# Altium footprint library AltiumLibrary.PcbLib: 129 footprints (part 1 of 9)
Each footprint in its own frame and in the unit in brackets; x right, y up, seen from the top. Pads: shape width x height; smd on the part's side, far side on the other; paste and mask are expansions set on the pad; w line width, h text height; cw(c..) or ccw(c..) is an arc to the next point about the centre after c.
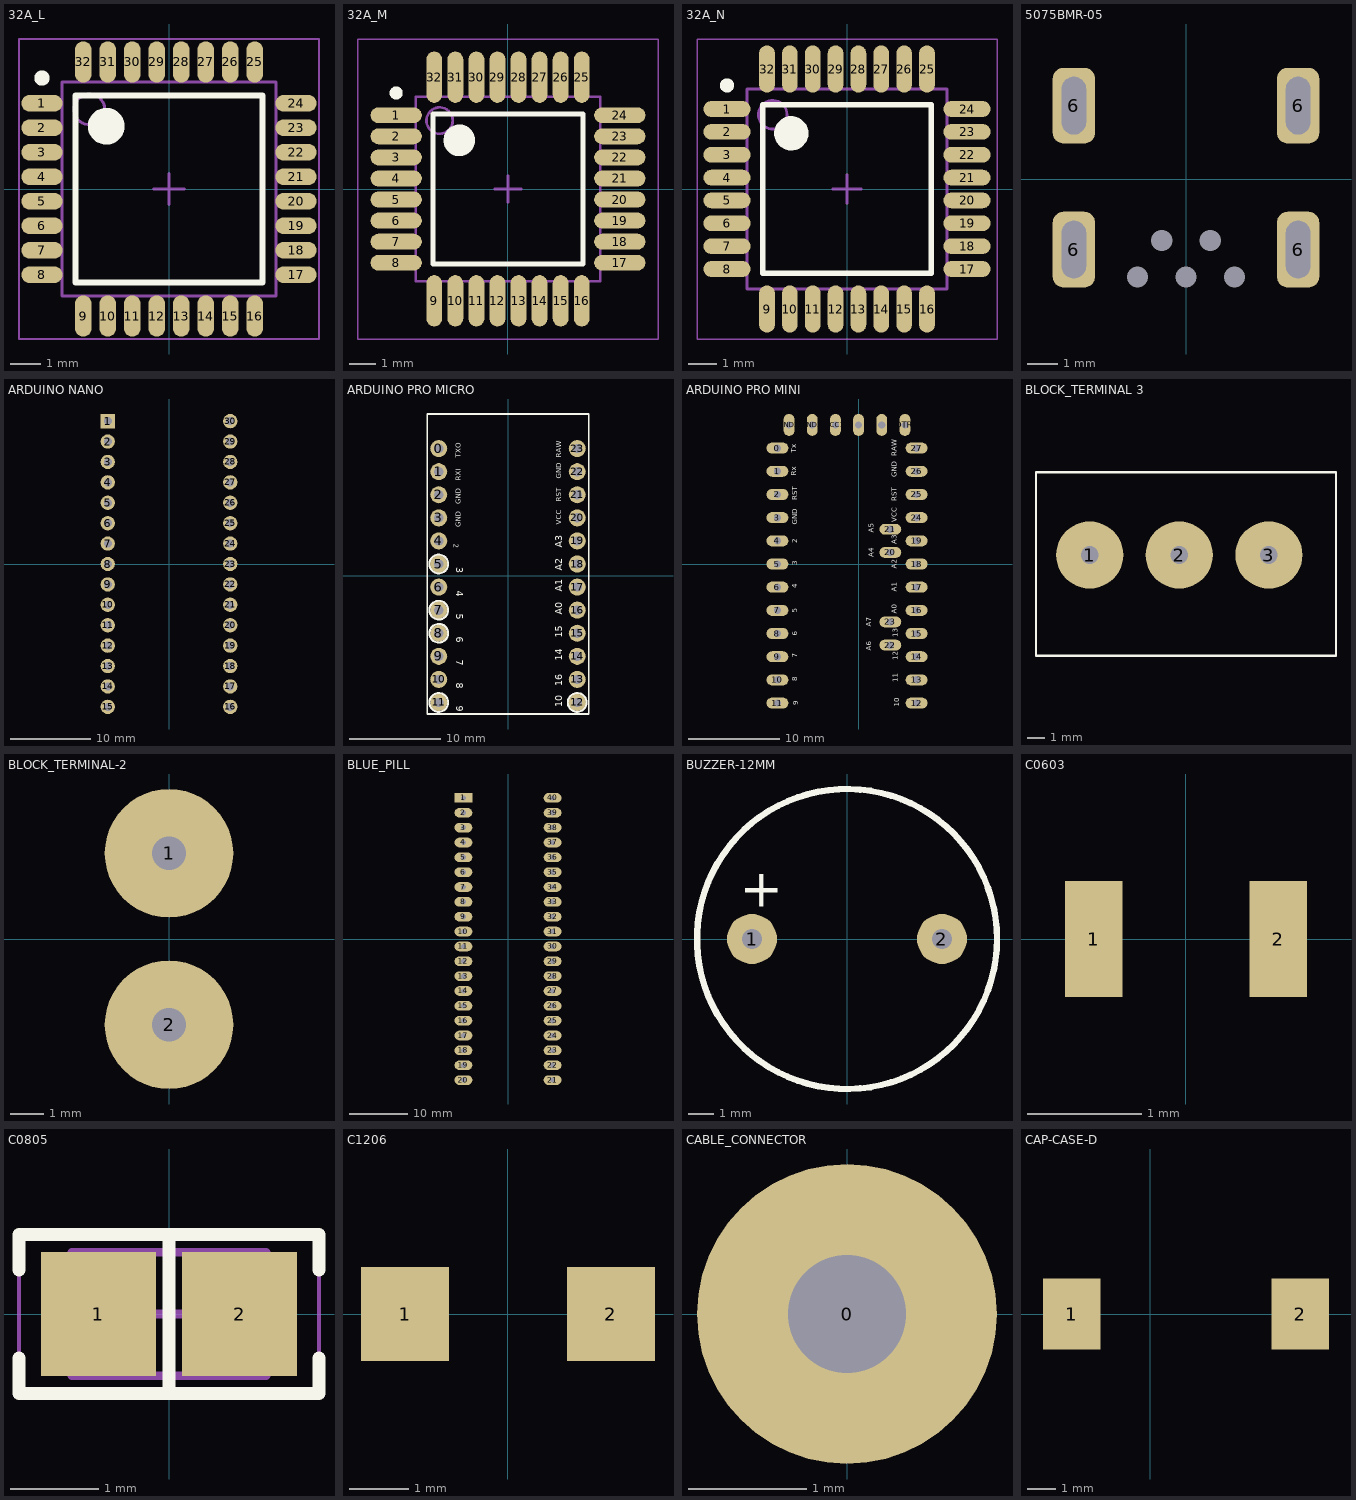
[diagram p0: the footprints below, top view; thin cyan lines are the x and y axes]

## 32A_L [mm] "Thin QFP, 32-Leads, Body 7x7mm, Pitch 0.8mm, IPC High Density"
height 1.2
pads (32):
  oval 1.35x0.55 smd: 1(-4.15,2.8) 2(-4.15,2) 3(-4.15,1.2) 4(-4.15,0.4) 5(-4.15,-0.4) 6(-4.15,-1.2) 7(-4.15,-2) 8(-4.15,-2.8) 17(4.15,-2.8) 18(4.15,-2) 19(4.15,-1.2) 20(4.15,-0.4) 21(4.15,0.4) 22(4.15,1.2) 23(4.15,2) 24(4.15,2.8)
  oval 0.55x1.35 smd: 9(-2.8,-4.15) 10(-2,-4.15) 11(-1.2,-4.15) 12(-0.4,-4.15) 13(0.4,-4.15) 14(1.2,-4.15) 15(2,-4.15) 16(2.8,-4.15) 25(2.8,4.15) 26(2,4.15) 27(1.2,4.15) 28(0.4,4.15) 29(-0.4,4.15) 30(-1.2,4.15) 31(-2,4.15) 32(-2.8,4.15)
Top Overlay:
  circle w0.6: c-2.05,2.05 r0.3
  circle w0.25: c-4.15,3.625 r0.125
  lines w0.2: -3.05,-3.05 3.05,-3.05 3.05,3.05 -3.05,3.05 -3.05,-3.05
Mechanical 13:
  circle w0.1: c-2.6,2.6 r0.5
  lines w0.1: -3.5,-3.5 3.5,-3.5 3.5,3.5 -3.5,3.5 -3.5,-3.5
Mechanical 15:
  lines w0.05: -4.9,-4.9 4.9,-4.9 4.9,4.9 -4.9,4.9 -4.9,-4.9
  lines w0.1: -0.5,0 0.5,0 ; 0,-0.5 0,0.5
3D body: height 1.2, standoff 0, extent -3.5,-3.5 3.5,3.5

## 32A_M [mm] "Thin QFP, 32-Leads, Body 7x7mm, Pitch 0.8mm, IPC Low Density"
height 1.2
pads (32):
  oval 1.95x0.6 smd: 1(-4.25,2.8) 2(-4.25,2) 3(-4.25,1.2) 4(-4.25,0.4) 5(-4.25,-0.4) 6(-4.25,-1.2) 7(-4.25,-2) 8(-4.25,-2.8) 17(4.25,-2.8) 18(4.25,-2) 19(4.25,-1.2) 20(4.25,-0.4) 21(4.25,0.4) 22(4.25,1.2) 23(4.25,2) 24(4.25,2.8)
  oval 0.6x1.95 smd: 9(-2.8,-4.25) 10(-2,-4.25) 11(-1.2,-4.25) 12(-0.4,-4.25) 13(0.4,-4.25) 14(1.2,-4.25) 15(2,-4.25) 16(2.8,-4.25) 25(2.8,4.25) 26(2,4.25) 27(1.2,4.25) 28(0.4,4.25) 29(-0.4,4.25) 30(-1.2,4.25) 31(-2,4.25) 32(-2.8,4.25)
Top Overlay:
  circle w0.25: c-4.25,3.65 r0.125
  circle w0.6: c-1.85,1.85 r0.3
  lines w0.2: -2.85,-2.85 -2.85,2.85 2.85,2.85 2.85,-2.85 -2.85,-2.85
Mechanical 13:
  circle w0.1: c-2.6,2.6 r0.5
  lines w0.1: -3.5,-3.5 -3.5,3.5 3.5,3.5 3.5,-3.5 -3.5,-3.5
Mechanical 15:
  lines w0.05: -5.7,-5.7 -5.7,5.7 5.7,5.7 5.7,-5.7 -5.7,-5.7
  lines w0.1: -0.5,0 0.5,0 ; 0,-0.5 0,0.5
3D body: height 1.2, standoff 0, extent -3.5,-3.5 3.5,3.5

## 32A_N [mm] "Thin QFP, 32-Leads, Body 7x7mm, Pitch 0.8mm, IPC Medium Density"
height 1.2
pads (32):
  oval 1.65x0.55 smd: 1(-4.2,2.8) 2(-4.2,2) 3(-4.2,1.2) 4(-4.2,0.4) 5(-4.2,-0.4) 6(-4.2,-1.2) 7(-4.2,-2) 8(-4.2,-2.8) 17(4.2,-2.8) 18(4.2,-2) 19(4.2,-1.2) 20(4.2,-0.4) 21(4.2,0.4) 22(4.2,1.2) 23(4.2,2) 24(4.2,2.8)
  oval 0.55x1.65 smd: 9(-2.8,-4.2) 10(-2,-4.2) 11(-1.2,-4.2) 12(-0.4,-4.2) 13(0.4,-4.2) 14(1.2,-4.2) 15(2,-4.2) 16(2.8,-4.2) 25(2.8,4.2) 26(2,4.2) 27(1.2,4.2) 28(0.4,4.2) 29(-0.4,4.2) 30(-1.2,4.2) 31(-2,4.2) 32(-2.8,4.2)
Top Overlay:
  circle w0.6: c-1.95,1.95 r0.3
  circle w0.25: c-4.2,3.625 r0.125
  lines w0.2: -2.95,-2.95 2.95,-2.95 2.95,2.95 -2.95,2.95 -2.95,-2.95
Mechanical 13:
  circle w0.1: c-2.6,2.6 r0.5
  lines w0.1: -3.5,-3.5 3.5,-3.5 3.5,3.5 -3.5,3.5 -3.5,-3.5
Mechanical 15:
  lines w0.05: -5.25,-5.25 5.25,-5.25 5.25,5.25 -5.25,5.25 -5.25,-5.25
  lines w0.1: -0.5,0 0.5,0 ; 0,-0.5 0,0.5
3D body: height 1.2, standoff 0, extent -3.5,-3.5 3.5,3.5

## 5075BMR-05 [mm]
pads (9):
  round 0 hole 0.7: 1(-1.6,-3.225) 2(-0.8,-2.025) 3(0,-3.225) 4(0.8,-2.025) 5(1.6,-3.225)
  rrect50% 1.4x2.5 hole 1.9 slot 0.8 at 0 deg: 6(-3.7,-2.325) 6(-3.7,2.425) 6(3.7,-2.325) 6(3.7,2.425)
Multi-Layer:
  region: 1.35,-1.475 1.35,-1.366 1.266,-1.163 1.112,-1.009 0.909,-0.925 0.691,-0.925 0.488,-1.009 0.334,-1.163 0.25,-1.366 0.25,-1.475 0.25,-2.025 0.25,-2.134 0.334,-2.337 0.488,-2.491 0.691,-2.575 0.909,-2.575 1.112,-2.491 1.266,-2.337 1.35,-2.134 1.35,-2.025
  region: -0.25,-1.475 -0.25,-1.366 -0.334,-1.163 -0.488,-1.009 -0.691,-0.925 -0.909,-0.925 -1.112,-1.009 -1.266,-1.163 -1.35,-1.366 -1.35,-1.475 -1.35,-2.025 -1.35,-2.134 -1.266,-2.337 -1.112,-2.491 -0.909,-2.575 -0.691,-2.575 -0.488,-2.491 -0.334,-2.337 -0.25,-2.134 -0.25,-2.025
  region: 1.05,-3.775 1.05,-3.884 1.134,-4.087 1.288,-4.241 1.491,-4.325 1.709,-4.325 1.912,-4.241 2.066,-4.087 2.15,-3.884 2.15,-3.775 2.15,-3.225 2.15,-3.116 2.066,-2.913 1.912,-2.759 1.709,-2.675 1.491,-2.675 1.288,-2.759 1.134,-2.913 1.05,-3.116 1.05,-3.225
  region: -0.55,-3.775 -0.55,-3.884 -0.466,-4.087 -0.312,-4.241 -0.109,-4.325 0.109,-4.325 0.312,-4.241 0.466,-4.087 0.55,-3.884 0.55,-3.775 0.55,-3.225 0.55,-3.116 0.466,-2.913 0.312,-2.759 0.109,-2.675 -0.109,-2.675 -0.312,-2.759 -0.466,-2.913 -0.55,-3.116 -0.55,-3.225
  region: -2.15,-3.775 -2.15,-3.884 -2.066,-4.087 -1.912,-4.241 -1.709,-4.325 -1.491,-4.325 -1.288,-4.241 -1.134,-4.087 -1.05,-3.884 -1.05,-3.775 -1.05,-3.225 -1.05,-3.116 -1.134,-2.913 -1.288,-2.759 -1.491,-2.675 -1.709,-2.675 -1.912,-2.759 -2.066,-2.913 -2.15,-3.116 -2.15,-3.225
3D body "SW3dPS-USB-Mini-B.STEP": height 3.95, standoff -1.8, extent -3.85,-3.4 3.85,5.6

## ARDUINO NANO [mil]
pads (30):
  rect 70x70 / inner round 63.62 / far side rect 63.62x63.62 hole 39.37: 1(-300,700)
  round 70 hole 39.37: 2(-300,600) 3(-300,500) 4(-300,400) 5(-300,300) 6(-300,200) 7(-300,100) 8(-300,0) 9(-300,-100) 10(-300,-200) 11(-300,-300) 12(-300,-400) 13(-300,-500) 14(-300,-600) 15(-300,-700) 16(300,-700) 17(300,-600) 18(300,-500) 19(300,-400) 20(300,-300) 21(300,-200) 22(300,-100) 23(300,0) 24(300,100) 25(300,200) 26(300,300) 27(300,400) 28(300,500) 29(300,600) 30(300,700)
3D body "User Library-arduino_nano.STEP": height 497.64, standoff -234.65, extent -352,-920.65 356.66,851

## ARDUINO PRO MICRO [mil]
pads (24):
  round 74 hole 40: 0(-300,550) 1(-300,450) 2(-300,350) 3(-300,250) 4(-300,150) 5(-300,50) 6(-300,-50) 7(-300,-150) 8(-300,-250) 9(-300,-350) 10(-300,-450) 11(-300,-550) 12(300,-550) 13(300,-450) 14(300,-350) 15(300,-250) 16(300,-150) 17(300,-50) 18(300,50) 19(300,150) 20(300,250) 21(300,350) 22(300,450) 23(300,550)
Top Overlay:
  circle w10: c300,-550 r40
  circle w10: c-300,-550 r40
  circle w10: c-300,50 r40
  circle w10: c-300,-150 r40
  circle w10: c-300,-250 r40
  lines w8: -350,-600 350,-600 350,700 -350,700 -350,-600
  text "10" at 235,-570 h30
  text "16" at 235,-480 h30
  text "14" at 235,-370 h30
  text "15" at 235,-270 h30
  text "A0" at 235,-170 h30
  text "A1" at 235,-70 h30
  text "A2" at 235,20 h30
  text "A3" at 235,120 h30
  text "VCC" at 231,220 h22
  text "RST" at 231,320 h22
  text "GND" at 231,420 h22
  text "RAW" at 231,510 h22
  text "TXO" at -204,510 h22
  text "RXI" at -204,410 h22
  text "GND" at -204,310 h22
  text "GND" at -204,210 h22
  text "2" at -236,137 h22
  text "3" at -225,35 h30
  text "4" at -225,-65 h30
  text "5" at -225,-165 h30
  text "6" at -225,-265 h30
  text "7" at -225,-365 h30
  text "8" at -225,-465 h30
  text "9" at -225,-565 h30
Bottom Overlay:
  lines w10: -350,-575 -325,-600 -275,-600 -250,-575 -250,-525 -275,-500 -250,-475 -250,-425 -275,-400 -250,-375 -250,-325 -275,-300 -250,-275 -250,-225 -275,-200 -250,-175 -250,-125 -275,-100 -250,-75 -250,-25 -275,0 -250,25 -250,75 -275,100 -250,125 -250,175 -275,200 -250,225 -250,275 -275,300 -250,325 -250,375 -275,400 -250,425 -250,475 -275,500 -250,525 -250,575 -275,600 -325,600 -350,575 -350,525 -325,500 -350,475 -350,425 -325,400 -350,375 -350,325 -325,300 -350,275 -350,225 -325,200 -350,175 -350,125 -325,100 -350,75 -350,25 -325,0 -350,-25 -350,-75 -325,-100 -350,-125 -350,-175 -325,-200 -350,-225 -350,-275 -325,-300 -350,-325 -350,-375 -325,-400 -350,-425 -350,-475 -325,-500 -350,-525 -350,-575 ; 250,-575 275,-600 325,-600 350,-575 350,-525 325,-500 350,-475 350,-425 325,-400 350,-375 350,-325 325,-300 350,-275 350,-225 325,-200 350,-175 350,-125 325,-100 350,-75 350,-25 325,0 350,25 350,75 325,100 350,125 350,175 325,200 350,225 350,275 325,300 350,325 350,375 325,400 350,425 350,475 325,500 350,525 350,575 325,600 275,600 250,575 250,525 275,500 250,475 250,425 275,400 250,375 250,325 275,300 250,275 250,225 275,200 250,175 250,125 275,100 250,75 250,25 275,0 250,-25 250,-75 275,-100 250,-125 250,-175 275,-200 250,-225 250,-275 275,-300 250,-325 250,-375 275,-400 250,-425 250,-475 275,-500 250,-525 250,-575
  text "JP1" at -189.5,-443 h30
3D body "ARDUINO PRO MICRO.STEP": height 167.32, standoff -356.3, extent -350,-600 350,761.81

## ARDUINO PRO MINI [mil]
pads (34):
  oval 94.5x47.25 hole 31.5: 0(-350,500) 1(-350,400) 2(-350,300) 3(-350,200) 4(-350,100) 5(-350,0) 6(-350,-100) 7(-350,-200) 8(-350,-300) 9(-350,-400) 10(-350,-500) 11(-350,-600) 12(250,-600) 13(250,-500) 14(250,-400) 15(250,-300) 16(250,-200) 17(250,-100) 18(250,0) 19(250,100) 20(137,50) 21(137,150) 22(137,-350) 23(137,-250) 24(250,200) 25(250,300) 26(250,400) 27(250,500)
  oval 47.25x94.5 hole 31.5: DTR(200,600) GND2(-300,600) GND3(-200,600) RX1-1(0,600) TX0-1(100,600) VCC1(-100,600)
Top Overlay:
  text "4" at -265,-105 h22
  text "3" at -265,-5 h22
  text "2" at -265,90 h22
  text "GND" at -265,170 h22
  text "RST" at -265,275 h22
  text "Rx" at -270,380 h22
  text "Tx" at -270,480 h22
  text "5" at -265,-210 h22
  text "6" at -265,-310 h22
  text "7" at -265,-405 h22
  text "9" at -260,-610 h22
  text "8" at -265,-505 h22
  text "11" at 170,-510 h22
  text "10" at 175,-615 h22
  text "12" at 170,-415 h22
  text "13" at 170,-315 h22
  text "A0" at 165,-215 h22
  text "A1" at 165,-120 h22
  text "A3" at 165,85 h22
  text "A2" at 165,-20 h22
  text "GND" at 165,375 h22
  text "RAW" at 165,465 h22
  text "RST" at 165,270 h22
  text "VCC" at 165,180 h22
  text "A4" at 65,30 h22
  text "A5" at 65,135 h22
  text "A6" at 55,-375 h22
  text "A7" at 55,-270 h22
3D body "ASSEMBLY_AP214.STEP": height 270.68, standoff -231.11, extent -400,-652 300,648

## BLOCK_TERMINAL 3 [mil]
pads (3):
  round 150 hole 39.37: 1(200,585) 2(400,585) 3(600,585)
Top Overlay:
  lines w5: 80,360 80,770 750,770 750,360 80,360
3D body "1935174.stp": height 459.35, standoff -127.26, extent 110,385.67 722.99,740

## BLOCK_TERMINAL-2 [mm]
pads (2):
  round 3.81 hole 1: 1(0,2.54) 2(0,-2.54)
3D body "User Library-TB2.STEP": height 10.16, standoff -3.34, extent -4.572,-5 3.428,5

## BLUE_PILL [mil]
pads (40):
  rect 120x65 hole 35.43: 1(-300,950)
  oval 120x65 hole 35.43: 2(-300,850) 3(-300,750) 4(-300,650) 5(-300,550) 6(-300,450) 7(-300,350) 8(-300,250) 9(-300,150) 10(-300,50) 11(-300,-50) 12(-300,-150) 13(-300,-250) 14(-300,-350) 15(-300,-450) 16(-300,-550) 17(-300,-650) 18(-300,-750) 19(-300,-850) 20(-300,-950) 21(300,-950) 22(300,-850) 23(300,-750) 24(300,-650) 25(300,-550) 26(300,-450) 27(300,-350) 28(300,-250) 29(300,-150) 30(300,-50) 31(300,50) 32(300,150) 33(300,250) 34(300,350) 35(300,450) 36(300,550) 37(300,650) 38(300,750) 39(300,850) 40(300,950)
3D body "STM32F103 - blue pill.step": height 637.71, standoff -81.58, extent -450,-1186.14 450,1080

## BUZZER-12MM [mm]
pads (2):
  round 2 hole 0.8: 1(-3.8,0) 2(3.8,0)
Top Overlay:
  circle w0.254: c0,0 r6
  text "+" at -4.3,1.3 h1.52
3D body "CUI_CEM-1205C.step": height 9.5, standoff -4.5, extent -6,-6 6,6

## C0603 [mil]
pads (2):
  rect 20x40 smd: 1(-31.89,0) 2(31.89,0)
3D body "User Library-0603 SMD Capacitor.step": height 11.89, standoff 0, extent -31.49,-15.74 31.5,15.75

## C0805 [mm]
height 1.15
pads (2):
  rect 1.3x1.4 smd: 1(-0.8,0) 2(0.8,0)
Top Overlay:
  lines w0.15: -1.7,-0.5 -1.7,-0.9 1.7,-0.9 1.7,-0.5 ; -1.7,0.5 -1.7,0.9 1.7,0.9 1.7,0.5 ; 0,-0.9 0,0.9
Mechanical 13:
  lines w0.1: -1.1,-0.7 -1.1,0.7 1.1,0.7 1.1,-0.7 -1.1,-0.7
Mechanical 15:
  lines w0.05: -1.7,-0.95 -1.7,0.95 1.7,0.95 1.7,-0.95 -1.7,-0.95
  lines w0.1: -0.5,0 0.5,0 ; 0,-0.5 0,0.5
3D body "0805 cap.STEP": height 1.26, standoff -0.02, extent -1,-0.637 1,0.637

## C1206 [mm]
pads (2):
  rect 1.5x1.6 smd: 1(-1.75,0) 2(1.75,0)
3D body "User Library-1206 SMD Capacitor.step": height 1.26, standoff 0.25, extent -1.6,-0.762 1.6,0.838

## CABLE_CONNECTOR [mm]
pads (1):
  round 2.54 hole 1 unplated: 0(0,0)

## CAP-CASE-D [mil]
pads (2):
  rect 80x100 smd: 1(-110,0) 2(210,0)
3D body "User Library-Tantalum Cap Case D.step": height 110.24, standoff 0, extent -90.55,-84.64 190.56,84.65